# Altium footprint library PERCRO_footprints.PcbLib: 177 footprints (part 3 of 12)
Each footprint in its own frame and in the unit in brackets; x right, y up, seen from the top. Pads: shape width x height; smd on the part's side, far side on the other; paste and mask are expansions set on the pad; w line width, h text height; cw(c..) or ccw(c..) is an arc to the next point about the centre after c.
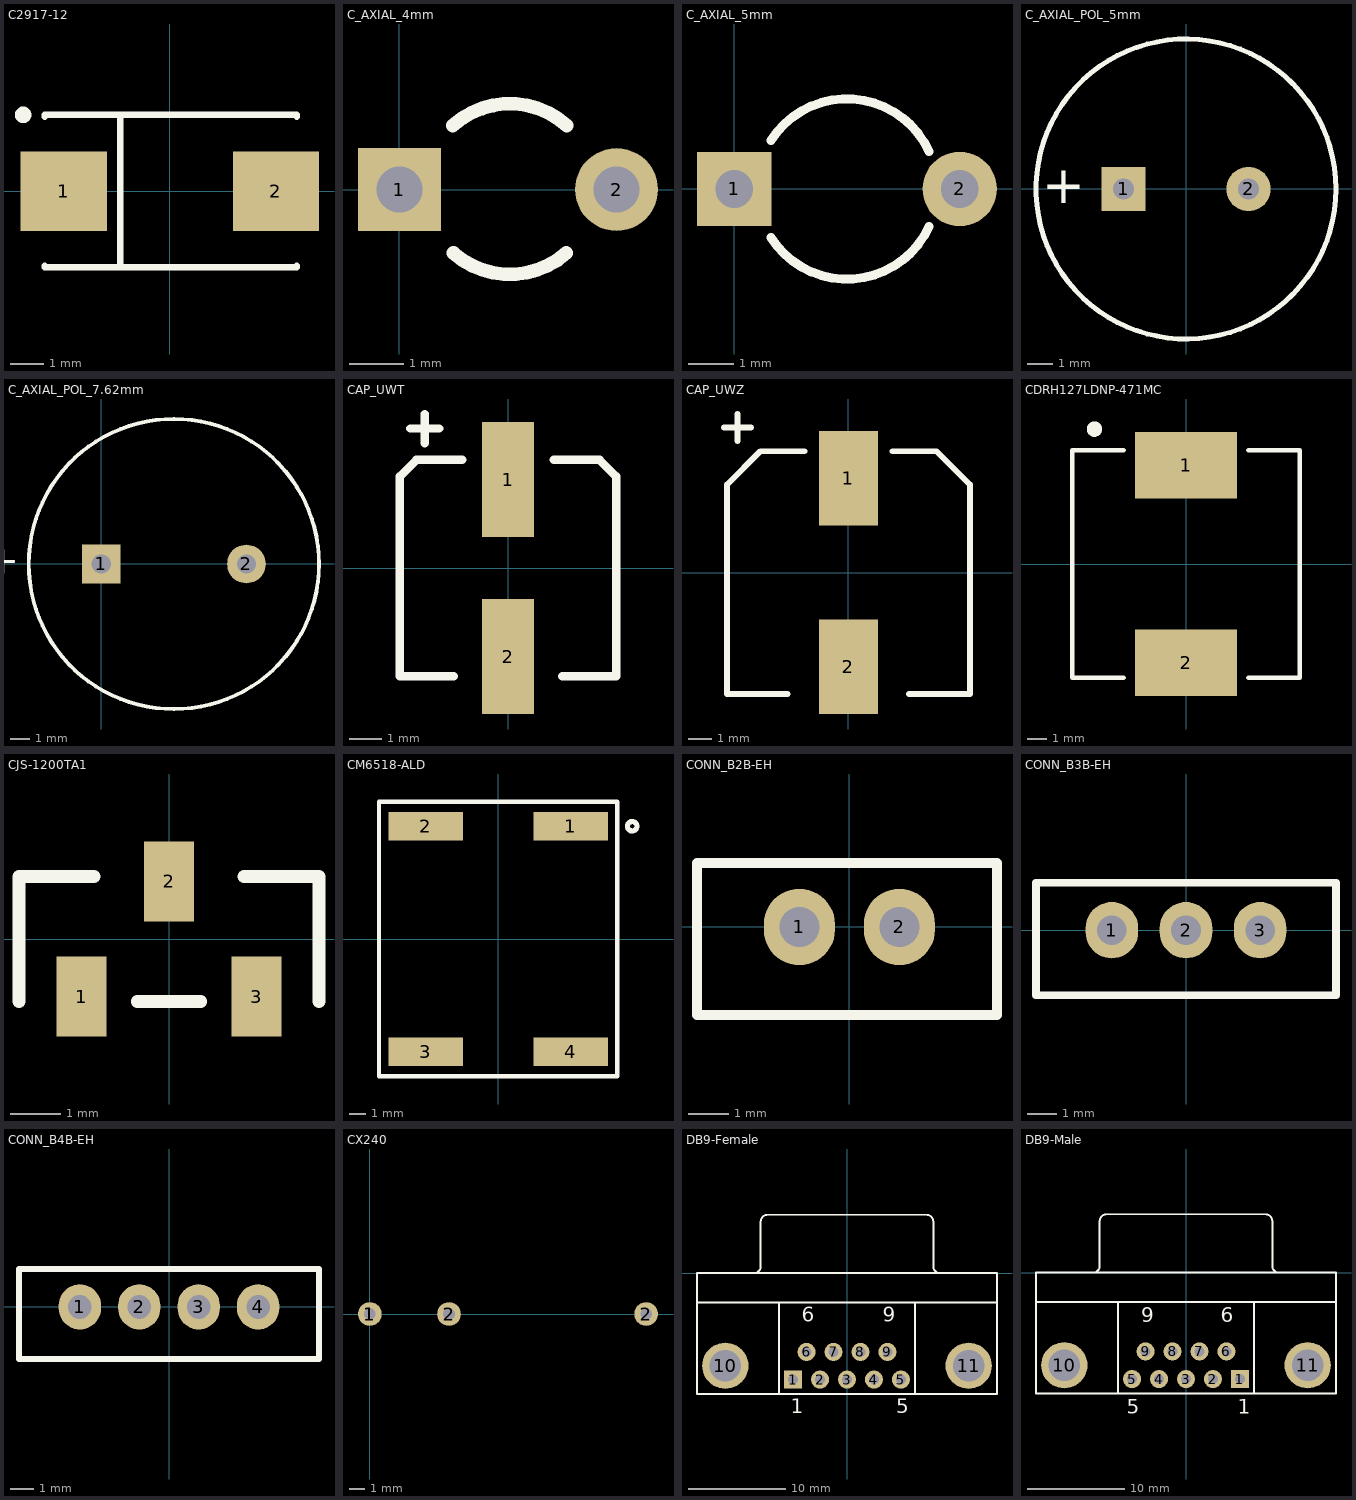
[diagram p2: the footprints below, top view; thin cyan lines are the x and y axes]

## C2917-12 [mm]
pads (2):
  rect 2.6x2.4 smd: 1(-3.2,0) 2(3.2,0)
Top Overlay:
  circle w0.25: c-4.425,2.3 r0.125
  lines w0.2: -3.775,-2.25 -3.775,-2.3 3.825,-2.3 3.825,-2.25 ; -3.775,2.25 -3.775,2.3 3.825,2.3 3.825,2.25 ; -1.5,-2.3 -1.5,2.3
3D body "Tantalum Cap Case D.step": height 2.8, standoff 0, extent -3.57,-2.15 3.57,2.15

## C_AXIAL_4mm [mil] "5mm (196.85mil)"
pads (2):
  rect 60x60 hole 33.47: 1(0,0)
  round 60 hole 33.47: 2(157.48,0)
Top Overlay:
  lines w10: 38.75,46.39 cw(c80.12,0.37) 121.35,46.51 ; 39.13,-45.98 ccw(c80.12,0.37) 120.97,-46.1

## C_AXIAL_5mm [mil] "5mm (196.85mil)"
pads (2):
  rect 65x65 hole 33: 1(0,0)
  round 65 hole 33: 2(196.85,0)
Top Overlay:
  lines w7.87: 32.03,-42.32 ccw(c98.43,0) 170.03,-32.74 ; 32.03,42.32 cw(c98.43,0) 170.03,32.74

## C_AXIAL_POL_5mm [mil] "5mm (196.85mil)"
pads (2):
  rect 70x70 hole 33: 1(-98.42,0)
  round 70 hole 33: 2(98.42,0)
Top Overlay:
  circle w7.87: c0,0 r236.22
  text "+" at -158.58,29.01 h59.06
3D body: height 984.25, standoff 0, extent -236.21,-236.21 236.23,236.23

## C_AXIAL_POL_7.62mm [mil] "7.62mm (300mil)"
pads (2):
  rect 80x80 hole 40: 1(0,0)
  round 80 hole 40: 2(300,0)
Top Overlay:
  circle w7.87: c150,0 r300
  text "+" at -170.15,29.01 h59.06
3D body: height 984.25, standoff 0, extent -142.94,-294.69 445.28,294.7

## CAP_UWT [mm] "SMD Capacitor 6.3mmx7.7mm (DxH)"
height 10
pads (2):
  rect 1.6x3.5 smd: 1(0,2.7) 2(0,-2.7)
Top Overlay:
  lines w0.254: -2.984,4.255 -2.095,4.255 ; -2.54,3.81 -2.54,4.699 ; -1.65,-3.3 -3.3,-3.3 -3.3,2.796 -2.796,3.3 -1.398,3.3 ; 1.398,3.3 2.796,3.3 3.3,2.796 3.3,-3.3 1.65,-3.3
3D body: height 7.7, standoff 0, extent -3.15,-3.147 3.15,3.147

## CAP_UWZ [mm] "SMD Capacitor 6.3mmx7.7mm (DxH)"
height 7.7
pads (2):
  rect 2.5x4 smd: 1(0,4) 2(0,-4)
Top Overlay:
  lines w0.254: -5.271,6.159 -4.127,6.159 ; -4.699,5.588 -4.699,6.731 ; -2.575,-5.15 -5.15,-5.15 -5.15,3.74 -3.74,5.15 -1.87,5.15 ; 1.87,5.15 3.74,5.15 5.15,3.74 5.15,-5.15 2.575,-5.15
3D body: height 10, standoff 0, extent -5.15,-5.147 5.15,5.147

## CDRH127LDNP-471MC [mm] "Inductor Sumida"
height 8
pads (2):
  rect 5.4x3.5 smd: 1(0,5.207) 2(0,-5.207)
Top Overlay:
  circle w0.406: c-4.826,7.112 r0.203
  lines w0.254: -3.302,-6 -6,-6 -6,6 -3.302,6 ; 3.302,-6 6,-6 6,6 3.302,6
3D body: height 8.1, standoff 0, extent -5.994,-6.045 6.02,5.969

## CJS-1200TA1 [mm] "Slide switches"
pads (3):
  rect 1x1.6 smd: 1(-1.75,-1.15) 2(0,1.15) 3(1.75,-1.15)
Top Overlay:
  lines w0.254: -3,-1.25 -3,1.25 -1.5,1.25 ; -0.635,-1.25 0.635,-1.25 ; 1.5,1.25 3,1.25 3,-1.25

## CM6518-ALD [mm] "Common mode chokes (coil)"
pads (4):
  rect 4.45x1.702 smd: 1(4.32,6.73) 2(-4.32,6.73) 3(-4.32,-6.73) 4(4.32,-6.73)
Top Overlay:
  circle w0.305: c8.001,6.731 r0.284
  lines w0.254: -7.11,-8.19 7.11,-8.19 7.11,8.19 -7.11,8.19 -7.11,-8.19
3D body: height 8.9, standoff 0, extent -7.11,-8.19 7.11,8.19

## CONN_B2B-EH [mm] "PCB connector 1X02_2.5mm"
pads (2):
  oval 1.778x1.905 hole 1: 1(-1.25,0) 2(1.25,0)
Top Overlay:
  lines w0.254: -3.81,-2.2 3.69,-2.2 3.69,1.6 -3.81,1.6 -3.81,-2.2
3D body "B2B-EH-A.step": height 6, standoff -3.2, extent -3.75,-2.2 3.75,1.6

## CONN_B3B-EH [mm] "PCB connector 1X03_2.5mm"
pads (3):
  oval 1.778x1.905 hole 1: 1(-2.5,0) 2(0,0) 3(2.5,0)
Top Overlay:
  lines w0.254: -5.06,-2.2 -5.06,1.6 5.06,1.6 5.06,-2.2 -5.06,-2.2
3D body "B3B-EH-A.STEP": height 6, standoff -3.2, extent -5,-2.2 5,1.6

## CONN_B4B-EH [mm] "PCB connector 1X04_2.5mm"
pads (4):
  oval 1.778x1.905 hole 1: 1(-3.75,0) 2(-1.25,0) 3(1.25,0) 4(3.75,0)
Top Overlay:
  lines w0.254: -6.31,-2.2 -6.31,1.6 6.31,1.6 6.31,-2.2 -6.31,-2.2
3D body "B4B-EH-A.STEP": height 6, standoff -3.2, extent -6.25,-2.2 6.25,1.6

## CX240 [mil] "RELAY SSR"
pads (4):
  round 60 hole 30: 1(0,0) 1(0,0) 2(200.79,0) 2(700.79,0)

## DB9-Female [mil] "Connector; D Subminiature; 9 Position; Right Angle; Pitch 1.385 mm"
height 501.97
pads (11):
  rect 73x73 hole 40: 1(-218.11,-429.92)
  round 73 hole 40: 2(-109.06,-429.92) 3(0,-429.92) 4(109.06,-429.92) 5(218.11,-429.92) 6(-163.58,-318.11) 7(-54.53,-318.11) 8(54.53,-318.11) 9(163.58,-318.11)
  round 187.4 hole 128.35: 10(-491.93,-374.02) 11(491.93,-374.02)
Top Overlay:
  lines w7.87: -606.3,-118.11 606.3,-118.11 ; -376.38,0.2 ccw(c-376.38,27.56) -349.02,27.56 -349.02,208.66 ; -348.82,208.86 cw(c-321.46,208.86) -321.46,236.22 321.46,236.22 cw(c321.46,208.86) 348.82,208.86 ; -275.59,-488.19 -275.59,-118.11 ; 275.59,-488.19 275.59,-118.11 ; 349.02,208.66 349.02,27.56 ccw(c376.38,27.56) 376.38,0.2 ; -606.3,-488.19 606.3,-488.19 606.3,0 -606.3,0 -606.3,-488.19
  text "6" at -183.27,-195.87 h59.06
  text "9" at 143.9,-195.87 h59.06
  text "5" at 198.43,-565.94 h59.06
  text "1" at -227.95,-565.94 h59.06
3D body "Connector DB-9.step": height 488.98, standoff 0, extent -612.02,-518.49 612.39,229.15

## DB9-Male [mil] "Connector; D Subminiature; 9 Position; Right Angle; Pitch 1.385 mm"
height 501.97
pads (11):
  rect 73x73 hole 40: 1(218.11,-429.92)
  round 73 hole 40: 2(109.06,-429.92) 3(0,-429.92) 4(-109.06,-429.92) 5(-218.11,-429.92) 6(163.58,-318.11) 7(54.53,-318.11) 8(-54.53,-318.11) 9(-163.58,-318.11)
  round 187.4 hole 128.35: 10(-491.93,-374.02) 11(491.93,-374.02)
Top Overlay:
  lines w7.87: -606.3,-118.11 606.3,-118.11 ; -376.38,0.2 ccw(c-376.38,27.56) -349.02,27.56 -349.02,208.66 ; -348.82,208.86 cw(c-321.46,208.86) -321.46,236.22 321.46,236.22 cw(c321.46,208.86) 348.82,208.86 ; -275.59,-488.19 -275.59,-118.11 ; 275.59,-488.19 275.59,-118.11 ; 349.02,208.66 349.02,27.56 ccw(c376.38,27.56) 376.38,0.2 ; -606.3,-488.19 -606.3,0 606.3,0 606.3,-488.19 -606.3,-488.19
  text "1" at 210,-570 h59.06
  text "5" at -240,-570 h59.06
  text "9" at -180,-200 h59.06
  text "6" at 140,-200 h59.06
3D body "DB9-Male.step": height 488.98, standoff 0, extent -612.02,-518.49 612.39,240.78